# Altium integrated library TTL Clock.IntLib: 25 symbols
Pins are listed as number, name and electrical type; pins without a type are passive.

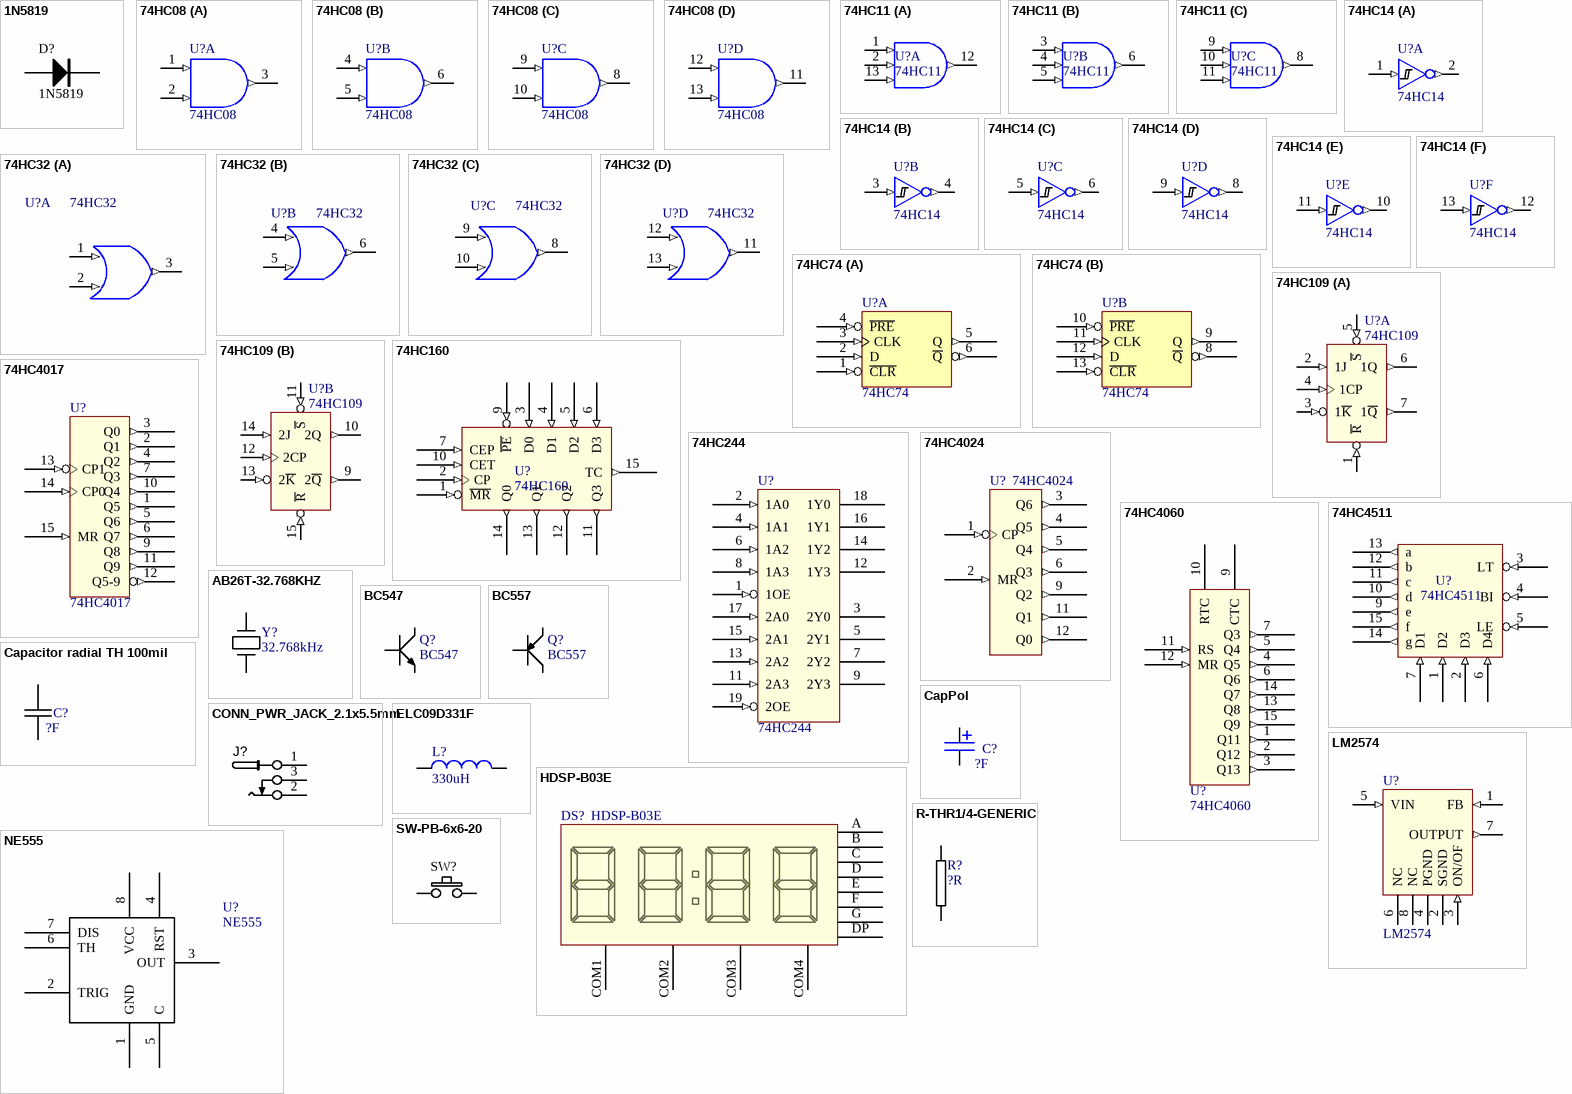
[diagram p0: symbols 1N5819 to SW-PB-6x6-20]

## 1N5819
designator D?
Schottky Diodes & Rectifiers 40V 1A; Specifications: 1A 40V; ComponentLink1Description: Datasheet; ComponentLink1URL: https://eu.mouser.com/datasheet/2/345/1n5817-1n5819-24580.pdf
footprint 1N500X
pins: A, K

## 74HC08
designator U?
Quadruple 2-Input Positive-AND Gate; ComponentLink1Description: Datasheet; ComponentLink1URL: http://www.ti.com/lit/ds/symlink/sn74hc08.pdf
footprint DIP14
part A pins: 1 A (in), 2 B (in), 3 Y (out), 7 GND (power) hidden to GND, 14 5V (power) hidden to 5V
part B pins: 4 A (in), 5 B (in), 6 Y (out)
part C pins: 8 Y (out), 9 A (in), 10 B (in)
part D pins: 11 Y (out), 12 A (in), 13 B (in)

## 74HC11
designator U?
Triple 3-input AND gate; ComponentLink1Description: Datasheet; ComponentLink1URL: http://www.ti.com/lit/ds/symlink/sn74hc11.pdf
footprint DIP14
part A pins: 1 (in), 2 (in), 12 (out), 13 (in)
part B pins: 3 (in), 4 (in), 5 (in), 6 (out)
part C pins: 7 GND (power) hidden to GND, 8 (out), 9 (in), 10 (in), 11 (in), 14 5V (power) hidden to 5V

## 74HC14
designator U?
IC INVERTER SCHMITT 6CH 14DIP; ComponentLink1Description: Datasheet; ComponentLink1URL: https://media.digikey.com/pdf/Data%20Sheets/Toshiba%20PDFs/TC74HC14.pdf
footprint DIP14
part A pins: 1 A (in), 2 Y (out), 7 GND (power) hidden to GND, 14 5V (power) hidden to 5V
part B pins: 3 A (in), 4 Y (out)
part C pins: 5 A (in), 6 Y (out)
part D pins: 8 Y (out), 9 A (in)
part E pins: 10 Y (out), 11 A (in)
part F pins: 12 Y (out), 13 A (in)

## 74HC32
designator U?
IC GATE OR 4CH 2-INP 14DIP; ComponentLink1Description: Datasheet; ComponentLink1URL: http://www.ti.com/lit/ds/symlink/sn74hc32.pdf
footprint DIP14
part A pins: 1 (in), 2 (in), 3 (out), 7 GND (power) hidden to GND, 14 5V (power) hidden to 5V
part B pins: 4 (in), 5 (in), 6 (out)
part C pins: 8 (out), 9 (in), 10 (in)
part D pins: 11 (out), 12 (in), 13 (in)

## 74HC74
designator U?
IC FF D-TYPE DUAL 1BIT 14DIP; ComponentLink1Description: Datasheet; ComponentLink1URL: http://www.ti.com/lit/ds/symlink/sn74hc74.pdf
footprint DIP14
part A pins: 1 ~{CLR} (in), 2 D (in), 3 CLK (in), 4 ~{PRE} (in), 5 Q (out), 6 ~{Q} (out), 7 GND (power) hidden to GND, 14 5V (power) hidden to 5V
part B pins: 8 ~{Q} (out), 9 Q (out), 10 ~{PRE} (in), 11 CLK (in), 12 D (in), 13 ~{CLR} (in)

## 74HC109
designator U?
Dual JK flip-flop with set and reset, positive edge clk; ComponentLink1Description: Datasheet; ComponentLink1URL: http://www.ti.com/lit/ds/symlink/sn74hc109.pdf
footprint DIP16
part A pins: 1 ~{R} (in) "Asynchronous reset", 2 1J (in), 3 1~{K} (in), 4 1CP (in), 5 ~{S} (in) "Asynchronous set", 6 1Q (out), 7 1~{Q} (out)
part B pins: 8 GND (power) hidden to GND, 9 2~{Q} (out), 10 2Q (out), 11 ~{S} (in) "Asynchronous set", 12 2CP (in), 13 2~{K} (in), 14 2J (in), 15 ~{R} (in) "Asynchronous reset", 16 5V (power) hidden to 5V

## 74HC160
designator U?
Presettable synchronous BCD  decade counter; asynchronous  reset; ComponentLink1Description: Datasheet; ComponentLink1URL: https://assets.nexperia.com/documents/data-sheet/74HC160.pdf
footprint DIP16
pins: 1 ~{MR} (in), 2 CP (in), 3 D0 (in), 4 D1 (in), 5 D2 (in), 6 D3 (in), 7 CEP (in) "Count enable input", 8 GND (power) hidden to GND, 9 ~{PE} (in), 10 CET (in) "Count enable carry input", 11 Q3 (out), 12 Q2 (out), 13 Q1 (out), 14 Q0 (out), 15 TC (out) "terminal count output", 16 5V (power) hidden to 5V

## 74HC244
designator U?
Octal buffer/line driver; 3-state; ComponentLink1Description: Datasheet; ComponentLink1URL: http://www.ti.com/lit/ds/symlink/sn74hc244.pdf
footprint DIP20
pins: 1 1OE (in), 2 1A0 (in), 3 2Y0, 4 1A1 (in), 5 2Y1, 6 1A2 (in), 7 2Y2, 8 1A3 (in), 9 2Y3, 10 GND (power) hidden to GND, 11 2A3 (in), 12 1Y3, 13 2A2 (in), 14 1Y2, 15 2A1 (in), 16 1Y1, 17 2A0 (in), 18 1Y0, 19 2OE (in), 20 5V (power) hidden to 5V

## 74HC4017
designator U?
Johnson decade counter with 10 decoded outputs; ComponentLink1Description: Datasheet; ComponentLink1URL: http://www.ti.com/lit/ds/symlink/cd74hc4017.pdf
footprint DIP16
pins: 1 Q5 (out), 2 Q1 (out), 3 Q0 (out), 4 Q2 (out), 5 Q6 (out), 6 Q7 (out), 7 Q3 (out), 8 GND (power) hidden to GND, 9 Q8 (out), 10 Q4 (out), 11 Q9 (out), 12 Q5-9 (out), 13 CP1 (in) "HIGH to LOW edge clock", 14 CP0 (in) "LOW ti HIGH clock", 15 MR (in), 16 5V (power) hidden to 5V

## 74HC4024
designator U?
7-stage binary ripple counter; ComponentLink1Description: Datasheet; ComponentLink1URL: http://www.ti.com/lit/ds/symlink/cd74hc4024.pdf
footprint DIP14
pins: 1 CP (in), 2 MR (in), 3 Q6 (out), 4 Q5 (out), 5 Q4 (out), 6 Q3 (out), 7 GND (power) hidden to GND, 9 Q2 (out), 11 Q1 (out), 12 Q0 (out), 14 5V (power) hidden to 5V

## 74HC4060
designator U?
14-stage binary ripple counter with oscillator
footprint DIP16
pins: 1 Q11 (out), 2 Q12 (out), 3 Q13 (out), 4 Q5 (out), 5 Q4 (out), 6 Q6 (out), 7 Q3 (out), 8 GND (power) hidden to GND, 9 CTC, 10 RTC, 11 RS (in), 12 MR (in), 13 Q8 (out), 14 Q7 (out), 15 Q9 (out), 16 5V (power) hidden to 5V

## 74HC4511
designator U?
IC DRVR 7 SEGMENT 1 DIGIT 16DIP; ComponentLink1Description: Datasheet; ComponentLink1URL: http://www.ti.com/lit/ds/symlink/cd74hc4511.pdf
footprint DIP16
pins: 1 D2 (in), 2 D3 (in), 3 LT (in) "Lamp test, displays 8", 4 BI (in) "Ripple blanking, turns off", 5 LE (in) "Latch enable", 6 D4 (in), 7 D1 (in), 8 GND (power) hidden to GND, 9 e (out), 10 d (out), 11 c (out), 12 b (out), 13 a (out), 14 g (out), 15 f (out), 16 5V (power) hidden to 5V

## AB26T-32.768KHZ
designator Y?, comment 32.768kHz
Crystal Oscillator 32.768kHz; Frequency: 32.768kHz; Specifications: 32.768kHz; ComponentLink1Description: Datasheet; ComponentLink1URL: https://abracon.com/Resonators/AB26T.pdf
footprint XTAL through hole (layout for 32768Hz crystal oscillator)
pins: 1, 2

## BC547
designator Q?
Bipolar Transistors - BJT NPN 45V 100mA HFE/800; ComponentLink1Description: Datasheet; ComponentLink1URL: https://eu.mouser.com/datasheet/2/308/BC547-1118654.pdf
footprint TO92
pins: 1 C, 2 B, 3 E

## BC557
designator Q?
Bipolar Transistors - BJT PNP -45V -100mA HFE/220; ComponentLink1Description: Datasheet; ComponentLink1URL: https://eu.mouser.com/datasheet/2/308/BC557-1118720.pdf
footprint TO92
pins: 1 C, 2 B, 3 E

## Capacitor radial TH 100mil
designator C?, comment ?F
Ceramic capacitor through hole 100mil pitch; Capacitance: ?F; Specifications: ?F
footprint CTH radial 100mil (Through hole capacitor radial 100 mil pitch)
pins: 1, 2

## CapPol
designator C?, comment ?F
Capacitor polarised; Capacitance: ?F; Specifications: ?F
footprint C_POL_Radial_220uF (8mmx12mm 3.5mm pitch)
footprint C_Pol_Radial_22uF (5mm x 12mm 2.5mm pitch)
pins: 1, 2

## CONN_PWR_JACK_2.1x5.5mm
designator J?  (value not drawn)
Power Connector, THT, 2.1mm ID, 5.5mm OD; ComponentLink1Description: Datasheet; ComponentLink1URL: https://www.cui.com/product/resource/pj-102ah.pdf
footprint CONN_PWR_JACK_2.1x5.5mm (Power Connector, 2.1mm ID, 5.5mm OD)
footprint CONN_PWR_JACK_2.1x5.5mm_PRO
pins: 1, 2, 3

## ELC09D331F
designator L?, comment 330uH
Fixed Inductors 330uH 10% 46A Radial Choke Coil; Inductance: 330uH; Specifications: 330uH; ComponentLink1Description: Datasheet; ComponentLink1URL: https://eu.mouser.com/datasheet/2/315/AGB0000C1-1108071.pdf
footprint ELC10D inductor (ELC10D panasonic inductor case, through hole, 3d body not entirely correct)
pins: 1, 2

## HDSP-B03E
designator DS?
LED Displays & Accessories 88:88 Clock Module 0.56in 4 Digits CC; ComponentLink1Description: Datasheet; ComponentLink1URL: https://www.broadcom.com/products/leds-and-displays/7-segment/through-hole/hdsp-b03e
footprint LED DISPLAY 4x7seg clock red
pins: A, B, C, COM1, COM2, COM3, COM4, D, DP, E, F, G

## LM2574
designator U?
Buck, Boost, Buck-Boost Switching Regulator IC Positive or Negative Fixed 5V 1 Output 500mA 8-DIP (0.300", 7.62mm); ComponentLink1Description: Datasheet; ComponentLink1URL: https://media.digikey.com/pdf/Data%20Sheets/ON%20Semiconductor%20PDFs/LM2574.pdf
footprint DIP8
pins: 1 FB (in), 2 SGND (power), 3 ON/OF (in), 4 PGND (power), 5 VIN (in), 6 NC, 7 OUTPUT (out), 8 NC

## NE555
designator U?
555 Type, Timer/Oscillator (Single) IC 100kHz 8-PDIP; ComponentLink1Description: Datasheet; ComponentLink1URL: http://www.ti.com/lit/ds/symlink/ne555.pdf
footprint DIP8
pins: 1 GND, 2 TRIG, 3 OUT, 4 RST, 5 C, 6 TH, 7 DIS, 8 VCC

## R-THR1/4-GENERIC
designator R?, comment ?R
GENERIC THROUGH HOLE 1/4 WATT RESISTOR; Resistance: ?R; Specifications: ?R
footprint R-vertical (Axial resistor vertically mounted)
footprint THR1/4-GENERIC (Through hole resistor axial 250mW)
pins: 1, 2

## SW-PB-6x6-20
designator SW?, comment SW-PB  (value not drawn)
Switch push-button 6x6mm 20mm height
footprint SW-PB-6x6-20 (Push-button 6x6mm 20mm height)
pins: 1, 2